# Altium footprint library PcbLib2.PcbLib: 41 footprints (part 1 of 3)
Each footprint in its own frame and in the unit in brackets; x right, y up, seen from the top. Pads: shape width x height; smd on the part's side, far side on the other; paste and mask are expansions set on the pad; w line width, h text height; cw(c..) or ccw(c..) is an arc to the next point about the centre after c.
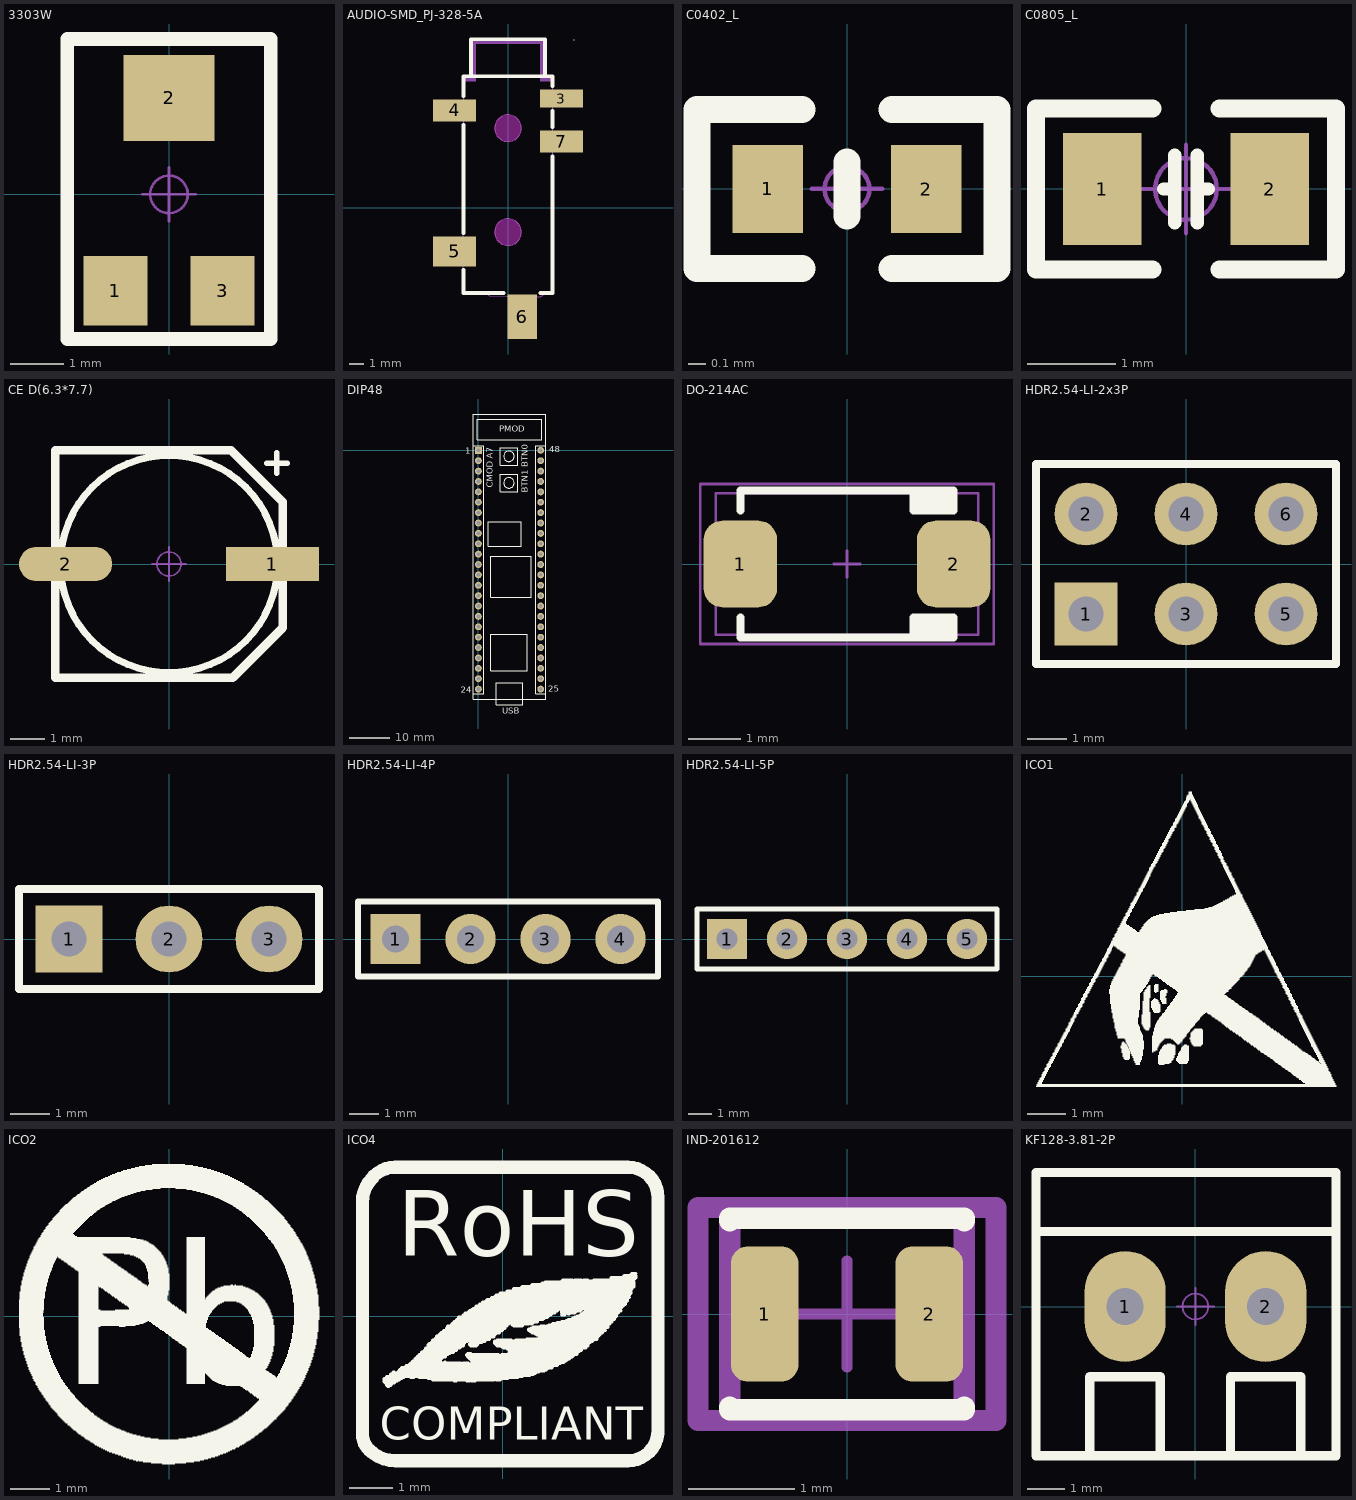
[diagram p0: the footprints below, top view; thin cyan lines are the x and y axes]

## 3303W [mm] "3.5*3.1*1.5mm"
pads (3):
  rect 1.2x1.3 smd: 1(-1,-1.8) 3(1,-1.8)
  rect 1.7x1.6 smd: 2(0,1.8)
Top Overlay:
  lines w0.254: -1.9,-2.7 -1.9,2.9 1.9,2.9 1.9,-2.7 -1.9,-2.7
Mechanical 15:
  circle w0.05: c0,0 r0.35
  lines w0.05: -0.5,0 0.5,0 ; 0,-0.5 0,0.5
3D body "3303w.STEP": height -0.39, standoff -1.85, extent -1.55,-2.055 1.55,2.05

## AUDIO-SMD_PJ-328-5A [mm]
pads (5):
  rect 2.9x1.2 smd paste+0 mask+0.051: 3(3.6,7.35)
  rect 2.9x1.5 smd paste+0 mask+0.051: 4(-3.6,6.55) 7(3.6,4.45)
  rect 2.9x2 smd paste+0 mask+0.051: 5(-3.6,-2.95)
  rect 2x3 smd paste+0 mask+0.051: 6(0.95,-7.35)
Top Overlay:
  lines w0.254: -3,-4.181 -3,-5.75 -0.281,-5.75 ; -3,-1.719 -3,5.569 ; -3,7.531 -3,8.85 3,8.85 3,8.181 ; -2.5,8.85 -2.5,11.35 2.5,11.35 2.5,8.85 ; 2.181,-5.75 3,-5.75 3,3.469 ; 3,5.431 3,6.519
Keep-Out Layer:
  board cut-out: 0.9,-1.65 0.9,-1.531 0.839,-1.303 0.72,-1.097 0.553,-0.93 0.347,-0.811 0.119,-0.75 -0.118,-0.75 -0.347,-0.811 -0.553,-0.93 -0.72,-1.097 -0.839,-1.302 -0.9,-1.531 -0.9,-1.65 -0.9,-1.768 -0.839,-1.997 -0.72,-2.203 -0.553,-2.37 -0.348,-2.489 -0.119,-2.55 0.118,-2.55 0.347,-2.489 0.553,-2.37 0.72,-2.203 0.839,-1.997 0.9,-1.768 0.9,-1.65
  board cut-out: 0.9,5.35 0.9,5.468 0.839,5.697 0.72,5.903 0.553,6.07 0.347,6.189 0.119,6.25 -0.118,6.25 -0.347,6.189 -0.553,6.07 -0.72,5.903 -0.839,5.698 -0.9,5.469 -0.9,5.35 -0.9,5.232 -0.839,5.003 -0.72,4.797 -0.553,4.63 -0.348,4.511 -0.119,4.45 0.118,4.45 0.347,4.511 0.553,4.63 0.72,4.797 0.839,5.003 0.9,5.232 0.9,5.35
Mechanical 1:
  circle w0.005: c0,-1.65 r0.9
  circle w0.005: c0,5.35 r0.9
Mechanical 6:
  region: 2.159,8.763 2.159,8.509 2.921,8.509 2.921,8.763
  region: -2.159,8.763 -2.921,8.763 -2.921,8.509 -2.159,8.509
  region: -2.159,11.303 2.159,11.303 2.159,11.049 -2.159,11.049
  region: 2.413,8.763 2.413,11.303 2.159,11.303 2.159,8.763
  region: -2.413,8.763 -2.413,11.303 -2.159,11.303 -2.159,8.763
Mechanical 15:
  region: 1.7,-8.198 0.2,-8.198 0.2,-6.198 1.7,-6.198
  region: -2.45,-2.251 -2.45,-3.751 -4.45,-3.751 -4.45,-2.251
  region: 2.45,3.894 2.45,4.894 4.45,4.894 4.45,3.894
  region: -2.45,6.999 -2.45,5.999 -4.45,5.999 -4.45,6.999
  region: 4.45,7.707 4.45,6.907 2.45,6.907 2.45,7.707
  region: 4.51,11.303 4.51,11.328 4.475,11.363 4.425,11.363 4.39,11.328 4.39,11.303 4.39,11.279 4.425,11.243 4.475,11.243 4.51,11.278 4.51,11.303
  lines w0.051: -3,-5.824 -1.467,-5.792 -1.176,-5.984 0.198,-6.007 0.199,-6.212 0.506,-6.211 1.442,-6.214 1.7,-6.203 1.704,-6.004 2.22,-5.998 2.459,-5.808 3,-5.824 3,8.776 2.498,8.798 2.505,11.294 -2.495,11.303 -2.5,8.798 -2.997,8.798 -3,-5.824
3D body "audio jack 4uconn 19269.step": height 5.1, standoff -0.7, extent -4.7,-7.62 4.7,11.38

## C0402_L [mm] "ÎÞ¼«ÐÔÌùÆ¬µçÈÝ"
pads (2):
  rect 0.4x0.5 smd: 1(-0.45,0) 2(0.45,0)
Top Overlay:
  lines w0.152: -0.254,-0.45 -0.85,-0.45 ; -0.254,0.45 -0.85,0.45 -0.85,-0.45 ; 0,-0.152 0,0.152 ; 0.254,-0.45 0.85,-0.45 0.85,0.45 0.254,0.45 ; -0.85,-0.45 -0.85,-0.45
Mechanical 15:
  circle w0.025: c0,0 r0.127
  lines w0.025: -0.2,0 0.2,0 ; 0,-0.2 0,0.2
3D body "c_0402.STEP": height 0.54, standoff 0.02, extent -0.5,-0.26 0.5,0.26

## C0805_L [mil] "ÎÞ¼«ÐÔÌùÆ¬µçÈÝ"
height 19.68
pads (2):
  rect 35x50 smd: 1(-37.4,0) 2(37.4,0)
Top Overlay:
  lines w6: -10,0 -5,0 ; -5,-15 -5,15 ; 5,-15 5,15 ; 5,0 10,0
  lines w8: -15,-36 -66.93,-36 -66.93,36 -15,36 ; 15,-36 66.93,-36 66.93,36 15,36
Mechanical 15:
  circle w1.97: c0,0 r13.78
  circle w1.97: c0,0 r13.78
  lines w1.97: -19.68,0 19.68,0 -19.68,0 ; 0,-19.68 0,19.68 0,-19.68
3D body "c_0805.STEP": height 21.08, standoff 0.61, extent -39.36,-24.01 39.38,24.02

## CE D(6.3*7.7) [mm] "ÌùÆ¬µç½âµçÈÝ£¬Ö±¾¶6.3mm£¬¸ß7.7mm"
pads (2):
  rect 2.7x1 smd: 1(3,0)
  oval 2.7x1 smd: 2(-3,0)
Top Overlay:
  circle w0.2: c0,0 r3.15
  lines w0.152: 2.829,2.925 3.429,2.925 ; 3.125,2.625 3.125,3.229
  lines w0.254: -3.3,-3.3 -3.3,3.3 1.8,3.3 3.3,1.8 3.3,-1.85 1.85,-3.3 -3.3,-3.3
Mechanical 15:
  circle w0.05: c0,0 r0.35
  lines w0.05: -0.5,0 0.5,0 ; 0,-0.5 0,0.5
3D body "CE_SMD_d_6_3x7_7.STEP": height 7.75, standoff 0.04, extent -3.5,-3.3 3.5,3.3

## DIP48 [mil]
pads (48):
  rect 66x66 hole 35.43: 1(0,0)
  round 66 hole 35.43: 2(0,-100) 3(0,-200) 4(0,-300) 5(0,-400) 6(0,-500) 7(0,-600) 8(0,-700) 9(0,-800) 10(0,-900) 11(0,-1000) 12(0,-1100) 13(0,-1200) 14(0,-1300) 15(0,-1400) 16(0,-1500) 17(0,-1600) 18(0,-1700) 19(0,-1800) 20(0,-1900) 21(0,-2000) 22(0,-2100) 23(0,-2200) 24(0,-2300) 25(600,-2300) 26(600,-2200) 27(600,-2100) 28(600,-2000) 29(600,-1900) 30(600,-1800) 31(600,-1700) 32(600,-1600) 33(600,-1500) 34(600,-1400) 35(600,-1300) 36(600,-1200) 37(600,-1100) 38(600,-1000) 39(600,-900) 40(600,-800) 41(600,-700) 42(600,-600) 43(600,-500) 44(600,-400) 45(600,-300) 46(600,-200) 47(600,-100) 48(600,0)
Top Overlay:
  circle w10: c293.7,-313.39 r50.56
  circle w10: c293.7,-57.48 r50.56
  lines w10: 181.89,-2451.18 418.11,-2451.18 ; 252.36,-2237.39 347.64,-2237.39 ; -50,-2400 -50,350 650,350 650,-2400 -50,-2400 ; -50,-2346.06 -50,45.87 49.99,45.87 49.99,-2346.06 -50,-2346.06 ; -10.01,100.8 -10,300.8 610,300.78 609.99,100.78 -10.01,100.8 ; 96.85,-923.62 96.85,-687.4 411.81,-687.4 411.81,-923.62 96.85,-923.62 ; 116.54,-2124.41 116.54,-1770.08 470.87,-1770.08 470.87,-2124.41 116.54,-2124.41 ; 116.54,-1415.75 116.54,-1022.05 510.24,-1022.05 510.24,-1415.75 116.54,-1415.75 ; 174.02,-2451.18 174.02,-2237.39 425.98,-2237.39 425.98,-2451.18 174.02,-2451.18 ; 209.8,-397.28 209.8,-229.49 377.6,-229.49 377.6,-397.28 209.8,-397.28 ; 209.8,-141.38 209.8,26.42 377.6,26.42 377.6,-141.38 209.8,-141.38 ; 550.01,-2346.06 550.01,45.87 650,45.87 650,-2346.06 550.01,-2346.06
  text "CMOD A7" at 140,-360 h60
  text "BTN1" at 475,-410 h60
  text "BTN0" at 475,-165 h60
  text "PMOD" at 200,180 h60
  text "USB" at 230,-2540 h60
  text "1" at -125,-35 h60
  text "24" at -170,-2335 h60
  text "25" at 675,-2325 h60
  text "48" at 680,-20 h60
3D body "Cmod_A7.stp": height 490.51, standoff -239.76, extent -50.01,-2451.21 650,350.01

## DO-214AC [mil]
pads (2):
  rrect50% 55x65 smd: 1(-80,0) 2(80,0)
Top Overlay:
  region: 50,40 50,55 80,55 80,40
  region: 50,-40 50,-55 80,-55 80,-40
  lines w6: -80,-40 -80,-55 80,-55 80,-40 50,-40 50,-55 ; -80,40 -80,55 80,55 80,40 50,40 50,55
Mechanical 13:
  lines w2: -10.01,-0.01 9.99,-0.01 ; -0.01,-10.01 -0.01,9.99 ; -98.44,-53.16 98.41,-53.16 98.41,53.14 -98.44,53.14 -98.44,-53.16
Mechanical 14:
  lines w2: -110,-60 -110,60 110,60 110,-60 -110,-60
3D body "User Library-DO-214AC_SMA.STEP": height 84.69, standoff -1.97, extent -98.44,-53.16 98.41,53.14

## HDR2.54-LI-2x3P [mm] "Ë«ÅÅÅÅÕë£¬2x3½Å"
pads (6):
  rect 1.6x1.6 hole 0.9: 1(-2.54,-1.27)
  round 1.6 hole 0.9: 2(-2.54,1.27) 3(0,-1.27) 4(0,1.27) 5(2.54,-1.27) 6(2.54,1.27)
Top Overlay:
  lines w0.2: -1.058,-2.54 3.81,-2.54 ; 3.81,-2.54 -3.81,-2.54 -3.81,2.54 3.81,2.54 3.81,-2.54
3D body "HDR2.54-1x2P.STEP": height 8.5, standoff -3, extent -1.27,-2.54 1.27,2.54
3D body "HDR2.54-1x2P.STEP": height 8.5, standoff -3, extent -3.81,-2.54 -1.27,2.54
3D body "HDR2.54-1x2P.STEP": height 8.5, standoff -3, extent 1.27,-2.54 3.81,2.54

## HDR2.54-LI-3P [mm] "ÅÅÕë£¬3½Å"
pads (3):
  rect 1.7x1.7 hole 0.9: 1(-2.54,0)
  round 1.7 hole 0.9: 2(0,0) 3(2.54,0)
Top Overlay:
  lines w0.2: -3.81,-1.27 3.81,-1.27 3.81,1.27 -3.81,1.27 -3.81,-1.27
3D body "HDR2.54-1P.STEP": height 2.54, standoff -8.96, extent -3.81,-1.27 -1.27,1.27
3D body "HDR2.54-1P.STEP": height 2.54, standoff -8.96, extent -1.27,-1.27 1.27,1.27
3D body "HDR2.54-1P.STEP": height 2.54, standoff -8.96, extent 1.27,-1.27 3.81,1.27

## HDR2.54-LI-4P [mm] "ÅÅÕë£¬4½Å"
pads (4):
  rect 1.7x1.7 hole 0.9: 1(-3.81,0)
  round 1.7 hole 0.9: 2(-1.27,0) 3(1.27,0) 4(3.81,0)
Top Overlay:
  lines w0.2: -5.08,-1.27 -5.08,1.27 5.08,1.27 5.08,-1.27 -5.08,-1.27
3D body "HDR2.54-1P.STEP": height 2.54, standoff -8.96, extent 2.54,-1.27 5.08,1.27
3D body "HDR2.54-1P.STEP": height 2.54, standoff -8.96, extent 0,-1.27 2.54,1.27
3D body "HDR2.54-1P.STEP": height 2.54, standoff -8.96, extent -2.54,-1.27 0,1.27
3D body "HDR2.54-1P.STEP": height 2.54, standoff -8.96, extent -5.08,-1.27 -2.54,1.27

## HDR2.54-LI-5P [mm] "ÅÅÕë£¬5½Å"
pads (5):
  rect 1.7x1.7 hole 0.9: 1(-5.08,0)
  round 1.7 hole 0.9: 2(-2.54,0) 3(0,0) 4(2.54,0) 5(5.08,0)
Top Overlay:
  lines w0.2: -6.35,-1.27 -6.35,1.27 6.35,1.27 6.35,-1.27 -6.35,-1.27
3D body "HDR2.54-1P.STEP": height 2.54, standoff -8.96, extent 3.81,-1.27 6.35,1.27
3D body "HDR2.54-1P.STEP": height 2.54, standoff -8.96, extent 1.27,-1.27 3.81,1.27
3D body "HDR2.54-1P.STEP": height 2.54, standoff -8.96, extent -1.27,-1.27 1.27,1.27
3D body "HDR2.54-1P.STEP": height 2.54, standoff -8.96, extent -3.81,-1.27 -1.27,1.27
3D body "HDR2.54-1P.STEP": height 2.54, standoff -8.96, extent -6.35,-1.27 -3.81,1.27

## ICO1 [mil]
Top Overlay:
  drawing of 990 lines, arcs and shapes, not listed

## ICO2 [mil]
Top Overlay:
  drawing of 960 lines, arcs and shapes, not listed

## ICO4 [mil]
Top Overlay:
  drawing of 1541 lines, arcs and shapes, not listed
  text "RoHS" at -96,55.06 h60
  text "COMPLIANT" at -112,-112.94 h30

## IND-201612 [mil]
pads (2):
  rrect50% 25x50 smd paste+0 mask+0: 1(-30.46,0) 2(30.46,0)
Top Overlay:
  lines w7.87: -43.31,-34.45 -43.31,-35.43 43.31,-35.43 43.31,-34.45 ; -43.31,34.45 -43.31,35.43 43.31,35.43 43.31,34.45
Mechanical 10:
  lines w7.87: -55.12,-39.37 -55.12,39.37 55.12,39.37 55.12,-39.37 -55.12,-39.37
Mechanical 12:
  lines w7.87: -43.31,-35.43 -43.31,35.43 43.31,35.43 43.31,-35.43 -43.31,-35.43
Mechanical 15:
  lines w3.94: -19.68,0 19.68,0 ; 0,-19.68 0,19.68
  lines w7.87: -55.12,-39.37 -55.12,39.37 55.12,39.37 55.12,-39.37 -55.12,-39.37
3D body "Ind_Murata.step": height 37.4, standoff 0, extent -39.37,-31.5 39.37,31.5

## KF128-3.81-2P [mm] "ÂÝ¶¤Ê½½ÓÏß¶Ë×Ó£¬½Å¾à3.81mm"
pads (2):
  oval 2.2x3 hole 1: 1(-1.905,0) 2(1.905,0)
Top Overlay:
  lines w0.254: -4.318,2.032 3.81,2.032 ; -2.857,-4.039 -2.857,-1.905 -0.953,-1.905 -0.953,-4.039 ; 0.953,-4.039 0.953,-1.905 2.857,-1.905 2.857,-4.039 ; -4.318,-4.039 3.81,-4.039 3.81,3.632 -4.318,3.632 -4.318,-4.039
Mechanical 15:
  circle w0.05: c0,0 r0.35
  lines w0.05: -0.5,0 0.5,0 ; 0,-0.5 0,0.5
3D body "KF128.STEP": height 8.55, standoff -3.95, extent -4.31,-3.9 0,3.5
3D body "KF128.STEP": height 8.55, standoff -3.95, extent -0.5,-3.9 3.81,3.5